# Altium integrated library Hoovic_Library.IntLib: 194 symbols
Pins are listed as number, name and electrical type; pins without a type are passive.

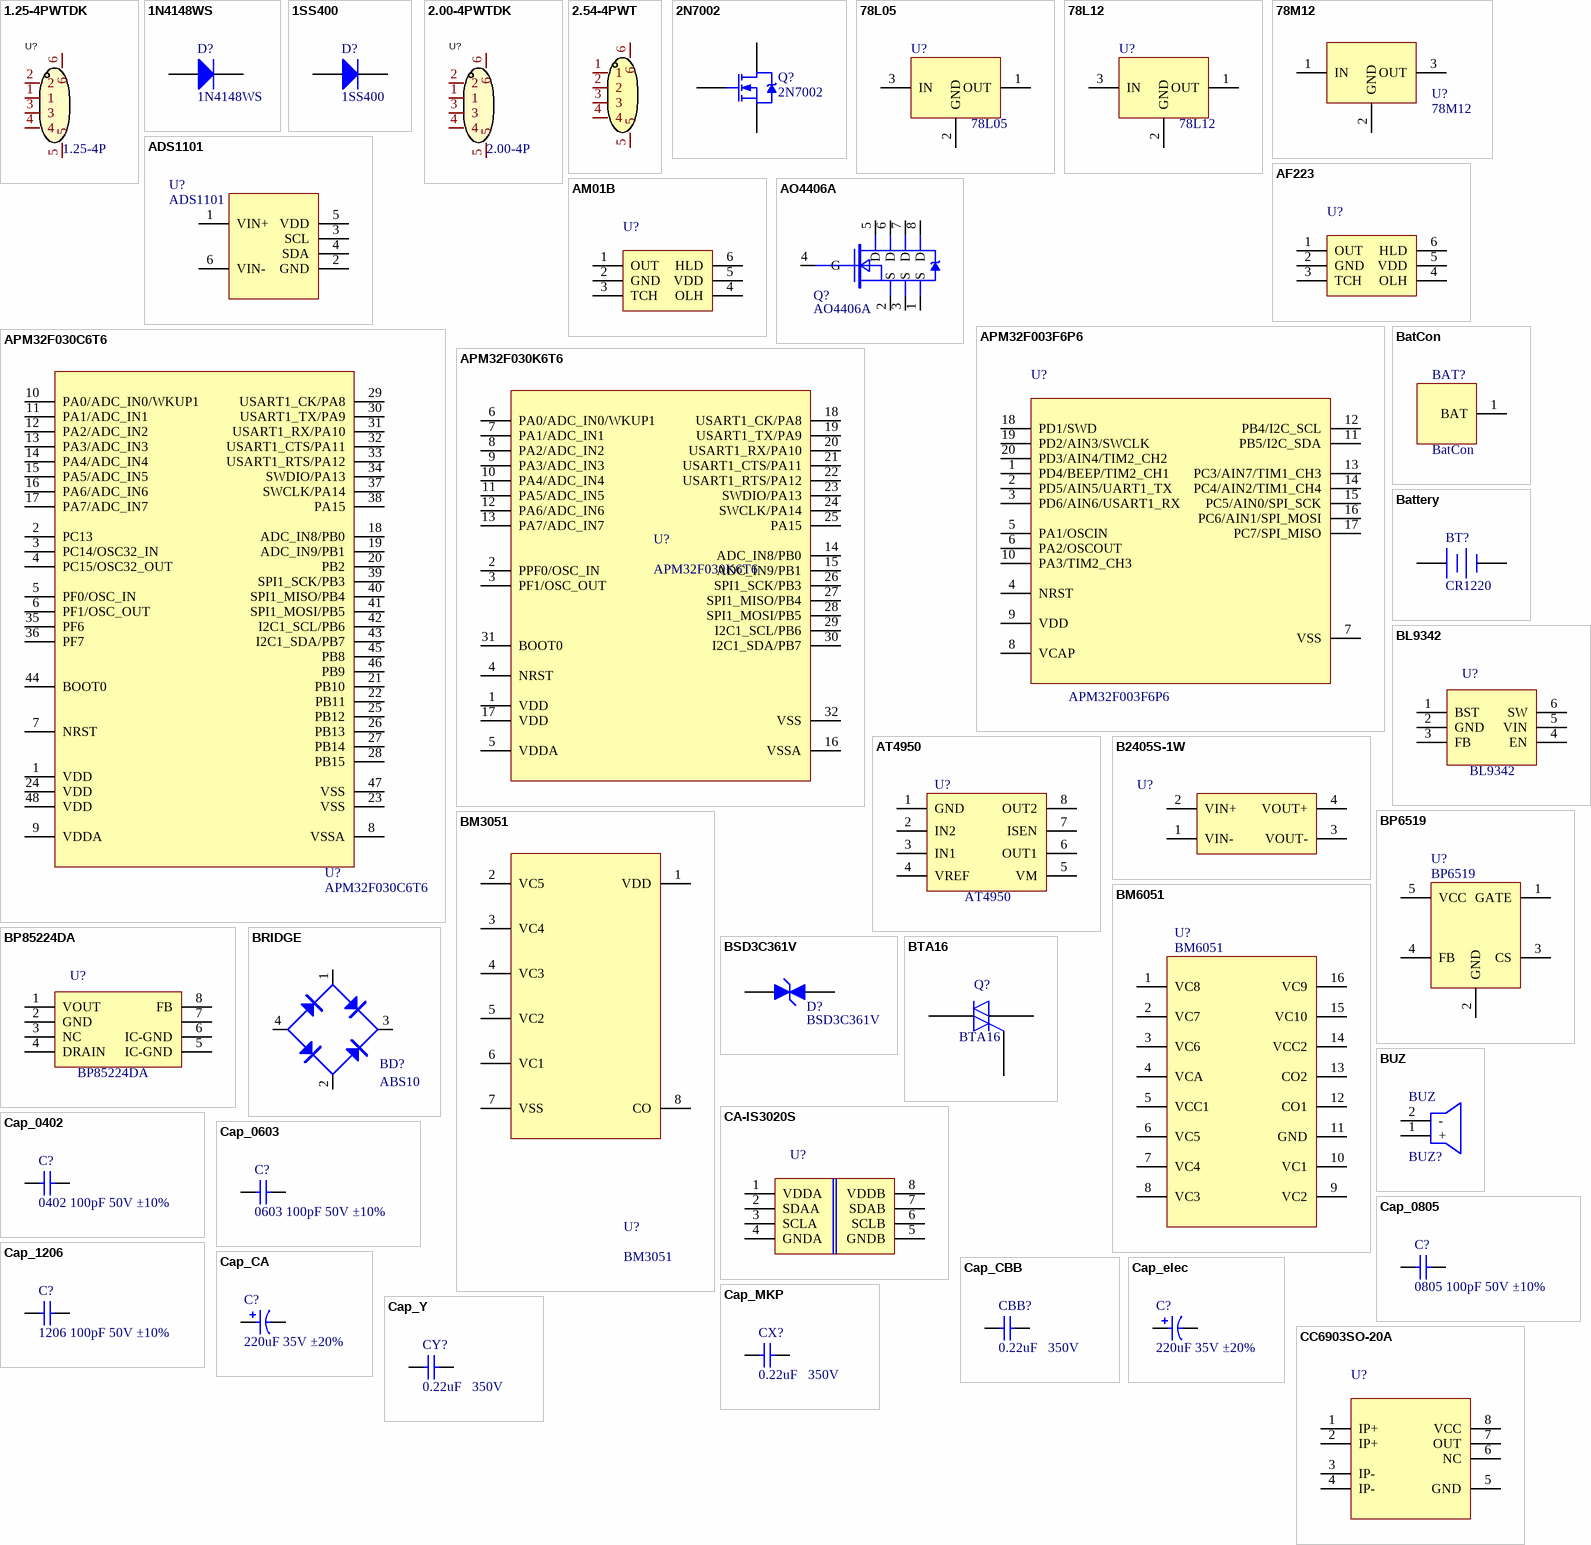
[diagram p0: symbols 1.25-4PWTDK to CC6903SO-20A]

## 1.25-4PWTDK
designator U?, comment 1.25-4P
连接器4pin，1.25间距; Manufacturer: SHOU HAN(首韩); Name: 1.25-4PWTDK; Add into BOM: yes; Pitch: 1.25mm; Pins Structure: 1x4P; Number of PINs Per Row: 4; Gender: 公型插针; Current Rating (Max): 1A; Symbol: 1.25-4PWTDK; Device: 1.25-4PWTDK; LCSC Part Name: 1.25间距 4P卧贴 带扣; Supplier Part: C3008554; Manufacturer Part: 1.25-4PWTDK; Supplier Footprint: SMD,P=1.25mm; JLCPCB Part Class: Extended Part; Datasheet: https://atta.szlcsc.com/upload/public/pdf/source/20220427/006CB3E3578F619E540A50F8B0C3F638.pdf; Supplier: LCSC; Convert to PCB: yes; Number of Rows: 1; Mounting Style: 卧贴; Operating Temperature Range: -25℃~+85℃
footprint CONN-SMD_4P-P1.25_GH-4AWB
3D model CONN-SMD_4P-P1.25_GH-4AWB
pins: 1, 2, 3, 4, 5, 6

## 1N4148WS
designator D?
贴片普通二极管 Vr=100V Io=150mA Vf=1.25V
footprint SOD-323F_L2.0-W1.6-LS2.5-RD
pins: 1 K, 2 A

## 1SS400
designator D?
贴片普通二极管 Vr=80V Io=100mA Vf=1.2V
footprint SOD-523
pins: 1 K, 2 A

## 2.00-4PWTDK
designator U?, comment 2.00-4P
连接器4pin，2.00间距; Manufacturer: SHOU HAN(首韩); Name: 1.25-4PWTDK; Add into BOM: yes; Pitch: 1.25mm; Pins Structure: 1x4P; Number of PINs Per Row: 4; Gender: 公型插针; Current Rating (Max): 1A; Symbol: 1.25-4PWTDK; Device: 1.25-4PWTDK; LCSC Part Name: 1.25间距 4P卧贴 带扣; Supplier Part: C3008554; Manufacturer Part: 1.25-4PWTDK; Supplier Footprint: SMD,P=1.25mm; JLCPCB Part Class: Extended Part; Datasheet: https://atta.szlcsc.com/upload/public/pdf/source/20220427/006CB3E3578F619E540A50F8B0C3F638.pdf; Supplier: LCSC; Convert to PCB: yes; Number of Rows: 1; Mounting Style: 卧贴; Operating Temperature Range: -25℃~+85℃
footprint CONN-SMD_4P-P2.00
3D model CONN-SMD_4P-P1.25_GH-4AWB
pins: 1, 2, 3, 4, 5, 6

## 2.54-4PWT
designator U?  (value not drawn)
连接器4pin，2.54间距; Manufacturer: SHOU HAN(首韩); Add into BOM: yes; Pitch: 2.5mm; Pins Structure: 1x4P; Number of PINs Per Row: 4; Gender: 公型插针; Current Rating (Max): 3A; Name: 2.54-4PWT; Symbol: 2.54-4PWT; Device: 2.54-4PWT; LCSC Part Name: 2.5mm 1x4P 卧贴 2.54间距 4P卧贴; Supplier Part: C3008582; Manufacturer Part: 2.54-4PWT; Supplier Footprint: SMD,P=2.5mm; JLCPCB Part Class: Extended Part; Datasheet: https://atta.szlcsc.com/upload/public/pdf/source/20220427/2E7F20871E2A02EADA0277D3DA8C9F6A.pdf; Supplier: LCSC; Convert to PCB: yes; Number of Rows: 1; Mounting Style: 卧贴; Operating Temperature Range: -25℃~+85℃
footprint COMM-SMD_4P-P2.50_SHOUHAN_2.54-4PWT
pins: 1, 2, 3, 4, 5, 6

## 2N7002
designator Q?
N-MOSFET with 3 Pin Vdss=60V  Id=115mA Vgs(th)=2.5V
footprint SOT-23-3-MOSFET
pins: 1 G, 2 D, 3 S

## 78L05
designator U?
电源芯片 Vin=30V Vout=5V 100mA 49dB@(120Hz)
footprint SOT-89
pins: 1 OUT, 2 GND, 3 IN

## 78L12
designator U?
电源芯片 Vin=27V Vout=12V 100mA 42dB@(120Hz)
footprint SOT-89
pins: 1 OUT, 2 GND, 3 IN

## 78M12
designator U?
电源芯片 Vin=35V Vout=12V 500mA 71dB@(120Hz)
footprint TO-252-2
pins: 1 IN, 2 GND, 3 OUT

## ADS1101
designator U?
转换芯片  带自校准功能的16it ADC 适用于2.7V~5.5V
footprint SOT-23-6
pins: 1 VIN+, 2 GND, 3 SCL, 4 SDA, 5 VDD, 6 VIN-

## AF223
designator U?  (value not drawn)
芯网单通道自校正触摸感应芯片
footprint SOT-23-6
pins: 1 OUT, 2 GND, 3 TCH, 4 OLH, 5 VDD, 6 HLD

## AM01B
designator U?  (value not drawn)
芯网单通道自校正触摸感应芯片
footprint SOT-23-6
pins: 1 OUT, 2 GND, 3 TCH, 4 OLH, 5 VDD, 6 HLD

## AO4406A
designator Q?
N-MOSFET with 8 Pin Vdss=30V Id=13A Vgs(th)=1.4V
footprint SOP-8_150mil
pins: 1 S, 2 S, 3 S, 4 G, 5 D, 6 D, 7 D, 8 D

## APM32F003F6P6
designator U?
极海APM32F003芯片TSSOP20封装
footprint TSSOP-20
footprint SOP-20_300mil
pins: 1 PD4/BEEP/TIM2_CH1, 2 PD5/AIN5/UART1_TX, 3 PD6/AIN6/USART1_RX, 4 NRST, 5 PA1/OSCIN, 6 PA2/OSCOUT, 7 VSS, 8 VCAP, 9 VDD, 10 PA3/TIM2_CH3, 11 PB5/I2C_SDA, 12 PB4/I2C_SCL, 13 PC3/AIN7/TIM1_CH3, 14 PC4/AIN2/TIM1_CH4, 15 PC5/AIN0/SPI_SCK, 16 PC6/AIN1/SPI_MOSI, 17 PC7/SPI_MISO, 18 PD1/SWD, 19 PD2/AIN3/SWCLK, 20 PD3/AIN4/TIM2_CH2

## APM32F030C6T6
designator U?
极海APM32F030芯片LQFP48封装
footprint LQFP-48
pins: 1 VDD, 2 PC13, 3 PC14/OSC32_IN, 4 PC15/OSC32_OUT, 5 PF0/OSC_IN, 6 PF1/OSC_OUT, 7 NRST, 8 VSSA, 9 VDDA, 10 PA0/ADC_IN0/WKUP1, 11 PA1/ADC_IN1, 12 PA2/ADC_IN2, 13 PA3/ADC_IN3, 14 PA4/ADC_IN4, 15 PA5/ADC_IN5, 16 PA6/ADC_IN6, 17 PA7/ADC_IN7, 18 ADC_IN8/PB0, 19 ADC_IN9/PB1, 20 PB2, 21 PB10, 22 PB11, 23 VSS, 24 VDD, 25 PB12, 26 PB13, 27 PB14, 28 PB15, 29 USART1_CK/PA8, 30 USART1_TX/PA9, 31 USART1_RX/PA10, 32 USART1_CTS/PA11, 33 USART1_RTS/PA12, 34 SWDIO/PA13, 35 PF6, 36 PF7, 37 SWCLK/PA14, 38 PA15, 39 SPI1_SCK/PB3, 40 SPI1_MISO/PB4, 41 SPI1_MOSI/PB5, 42 I2C1_SCL/PB6, 43 I2C1_SDA/PB7, 44 BOOT0, 45 PB8, 46 PB9, 47 VSS, 48 VDD

## APM32F030K6T6
designator U?
极海APM32F030芯片LQFP32封装
footprint LQFP-32
pins: 1 VDD, 2 PPF0/OSC_IN, 3 PF1/OSC_OUT, 4 NRST, 5 VDDA, 6 PA0/ADC_IN0/WKUP1, 7 PA1/ADC_IN1, 8 PA2/ADC_IN2, 9 PA3/ADC_IN3, 10 PA4/ADC_IN4, 11 PA5/ADC_IN5, 12 PA6/ADC_IN6, 13 PA7/ADC_IN7, 14 ADC_IN8/PB0, 15 ADC_IN9/PB1, 16 VSSA, 17 VDD, 18 USART1_CK/PA8, 19 USART1_TX/PA9, 20 USART1_RX/PA10, 21 USART1_CTS/PA11, 22 USART1_RTS/PA12, 23 SWDIO/PA13, 24 SWCLK/PA14, 25 PA15, 26 SPI1_SCK/PB3, 27 SPI1_MISO/PB4, 28 SPI1_MOSI/PB5, 29 I2C1_SCL/PB6, 30 I2C1_SDA/PB7, 31 BOOT0, 32 VSS

## AT4950
designator U?
单通道刷式直流电机驱动芯片
footprint SOP-8_150mil
pins: 1 GND, 2 IN2, 3 IN1, 4 VREF, 5 VM, 6 OUT1, 7 ISEN, 8 OUT2

## B2405S-1W
designator U?, comment BXXXS-1W  (value not drawn)
隔离型DCDC
footprint B2405S-1W
pins: 1 VIN-, 2 VIN+, 3 VOUT-, 4 VOUT+

## BatCon
designator BAT?
镍片 BMS产品电池连接端口
footprint BatCon_End_8mm
footprint BatCon_Mid_5mm
footprint BatCon_3936_5MM
footprint BatCon_3936_6.5MM
footprint BatCon_K55 (Battery connect pad for Kanaijia designed K55 BLDC)
footprint UVWPORT_C55
footprint UVWPORT_K55 (For connection of Kanaijia designed K55 BLDC)
footprint BATCON_M211
footprint BatCon_187W
footprint BatCon_L6.3-P5.0MM
footprint BatCon_4.8mm
pins: 1 BAT

## Battery
designator BT?, comment CR1220
电池/电池组
footprint BAT-SMD_CR1220-2ZX
pins: 1 +, 2 -

## BL9342
designator U?
DC-DC降压型
footprint SOT-23-6
pins: 1 BST, 2 GND, 3 FB, 4 EN, 5 VIN, 6 SW

## BM3051
designator U?
二次保护芯片 2~5 Cells Secondary Protection IC
footprint MSOP-8
footprint DFN-8_L2.5-W2.0-P0.50
pins: 1 VDD, 2 VC5, 3 VC4, 4 VC3, 5 VC2, 6 VC1, 7 VSS, 8 CO

## BM6051
designator U?
二次保护芯片 6~10 Cells Secondary Protection IC
footprint SOP-16_150mil
pins: 1 VC8, 2 VC7, 3 VC6, 4 VCA, 5 VCC1, 6 VC5, 7 VC4, 8 VC3, 9 VC2, 10 VC1, 11 GND, 12 CO1, 13 CO2, 14 VCC2, 15 VC10, 16 VC9

## BP6519
designator U?
非隔离恒压恒流控制芯片
footprint SOT-23-5
pins: 1 GATE, 2 GND, 3 CS, 4 FB, 5 VCC

## BP85224DA
designator U?
AC-DC降压型
footprint SOP-8_150mil
pins: 1 VOUT, 2 GND, 3 NC, 4 DRAIN, 5 IC-GND, 6 IC-GND, 7, 8 FB

## BRIDGE
designator BD?, comment ABS10
整流桥
footprint ABS10
footprint GBJ3510
footprint GBP_4P-L14.5-W3.5-P3.80-L
pins: 1 AC, 2 AC, 3 V+, 4 V-

## BSD3C361V
designator D?
静电放电(ESD)保护器件
footprint SOD-323_L1.8-W1.3-LS2.5-BI
pins: 1 C, 2 A

## BTA16
designator Q?
可控硅
footprint TO-220A
pins: 1, 2, 3

## BUZ
designator BUZ?
蜂鸣器
footprint BUZ-TH-D14-P7.5
pins: 1 +, 2 -

## CA-IS3020S
designator U?  (value not drawn)
低功耗双向通讯I2C总线隔离器
footprint SOP-8_150mil
pins: 1 VDDA, 2 SDAA, 3 SCLA, 4 GNDA, 5 GNDB, 6 SCLB, 7 SDAB, 8 VDDB

## Cap_0402
designator C?, comment 0402 100pF 50V ±10%
贴片电容
footprint C0402
pins: 1, 2

## Cap_0603
designator C?, comment 0603 100pF 50V ±10%
贴片电容
footprint C0603
pins: 1, 2

## Cap_0805
designator C?, comment 0805 100pF 50V ±10%
贴片电容
footprint C0805
footprint C0805 - PADS
pins: 1, 2

## Cap_1206
designator C?, comment 1206 100pF 50V ±10%
贴片电容
footprint C1206
footprint C1206 - PADS
pins: 1, 2

## Cap_CA
designator C?, comment 220uF 35V ±20%
钽电容
footprint CASE-A_3216
pins: 1, 2
1 alternate drawing of the same symbol

## Cap_CBB
designator CBB?, comment 0.22uF   350V
CBB电容
footprint CAP-TH-CBB_L16.5-W10-H14.5-P15MM
pins: 1, 2

## Cap_elec
designator C?, comment 220uF 35V ±20%
电解电容
footprint CAP-TH_BD6.3-P2.50-D1.0-FD
footprint CAP-TH_BD8-P3.50-D1.0-FD
footprint CAP-TH_BD10-P5.0-D1.0-FD
footprint CAP-TH_BD18-P7.5-D1.1
footprint CAP-TH_BD5.0-P2.00-D0.6-FD
footprint CAP-SMD_D6.3-L7.7
footprint CAP_TH-BD50-D35-P10.5MM
footprint CAP-TH_BD12.5-D6.5-P2.5MM
footprint CAP-TH_BD16.5-D8.0-P2.5MM
footprint CAP-TH_BD12.5-P5.00-D0.6-FD
footprint CAP-SMD_BD8.0-L8.3-W8.3-FD
footprint CAP-SMD_BD6.3-L6.6-W6.6-LS7.4-FD
footprint CAP-TH_BD8-P3.50-D1.0-WD
footprint CAP-TH_BD6.3-P2.50-D1.0-WD
pins: 1, 2
1 alternate drawing of the same symbol

## Cap_MKP
designator CX?, comment 0.22uF   350V
安规电容
footprint CAP-TH-MKP_L12.5-W6.0-H12-P10MM
footprint CAP-TH-MKP_L13-W6-P10
footprint CAP-TH-MKP_L17-W10-H16-P15MM
footprint CAP-TH-MKP_L18-W10-H18-P15
pins: 1, 2

## Cap_Y
designator CY?, comment 0.22uF   350V
Y电容
footprint CAP-TH-Y_L10-W4-P10MM
pins: 1, 2

## CC6903SO-20A
designator U?  (value not drawn)
单芯片霍尔效应电流传感器 20A
footprint SOP-8_150mil
pins: 1 IP+, 2 IP+, 3 IP-, 4 IP-, 5 GND, 6 NC, 7 OUT, 8 VCC

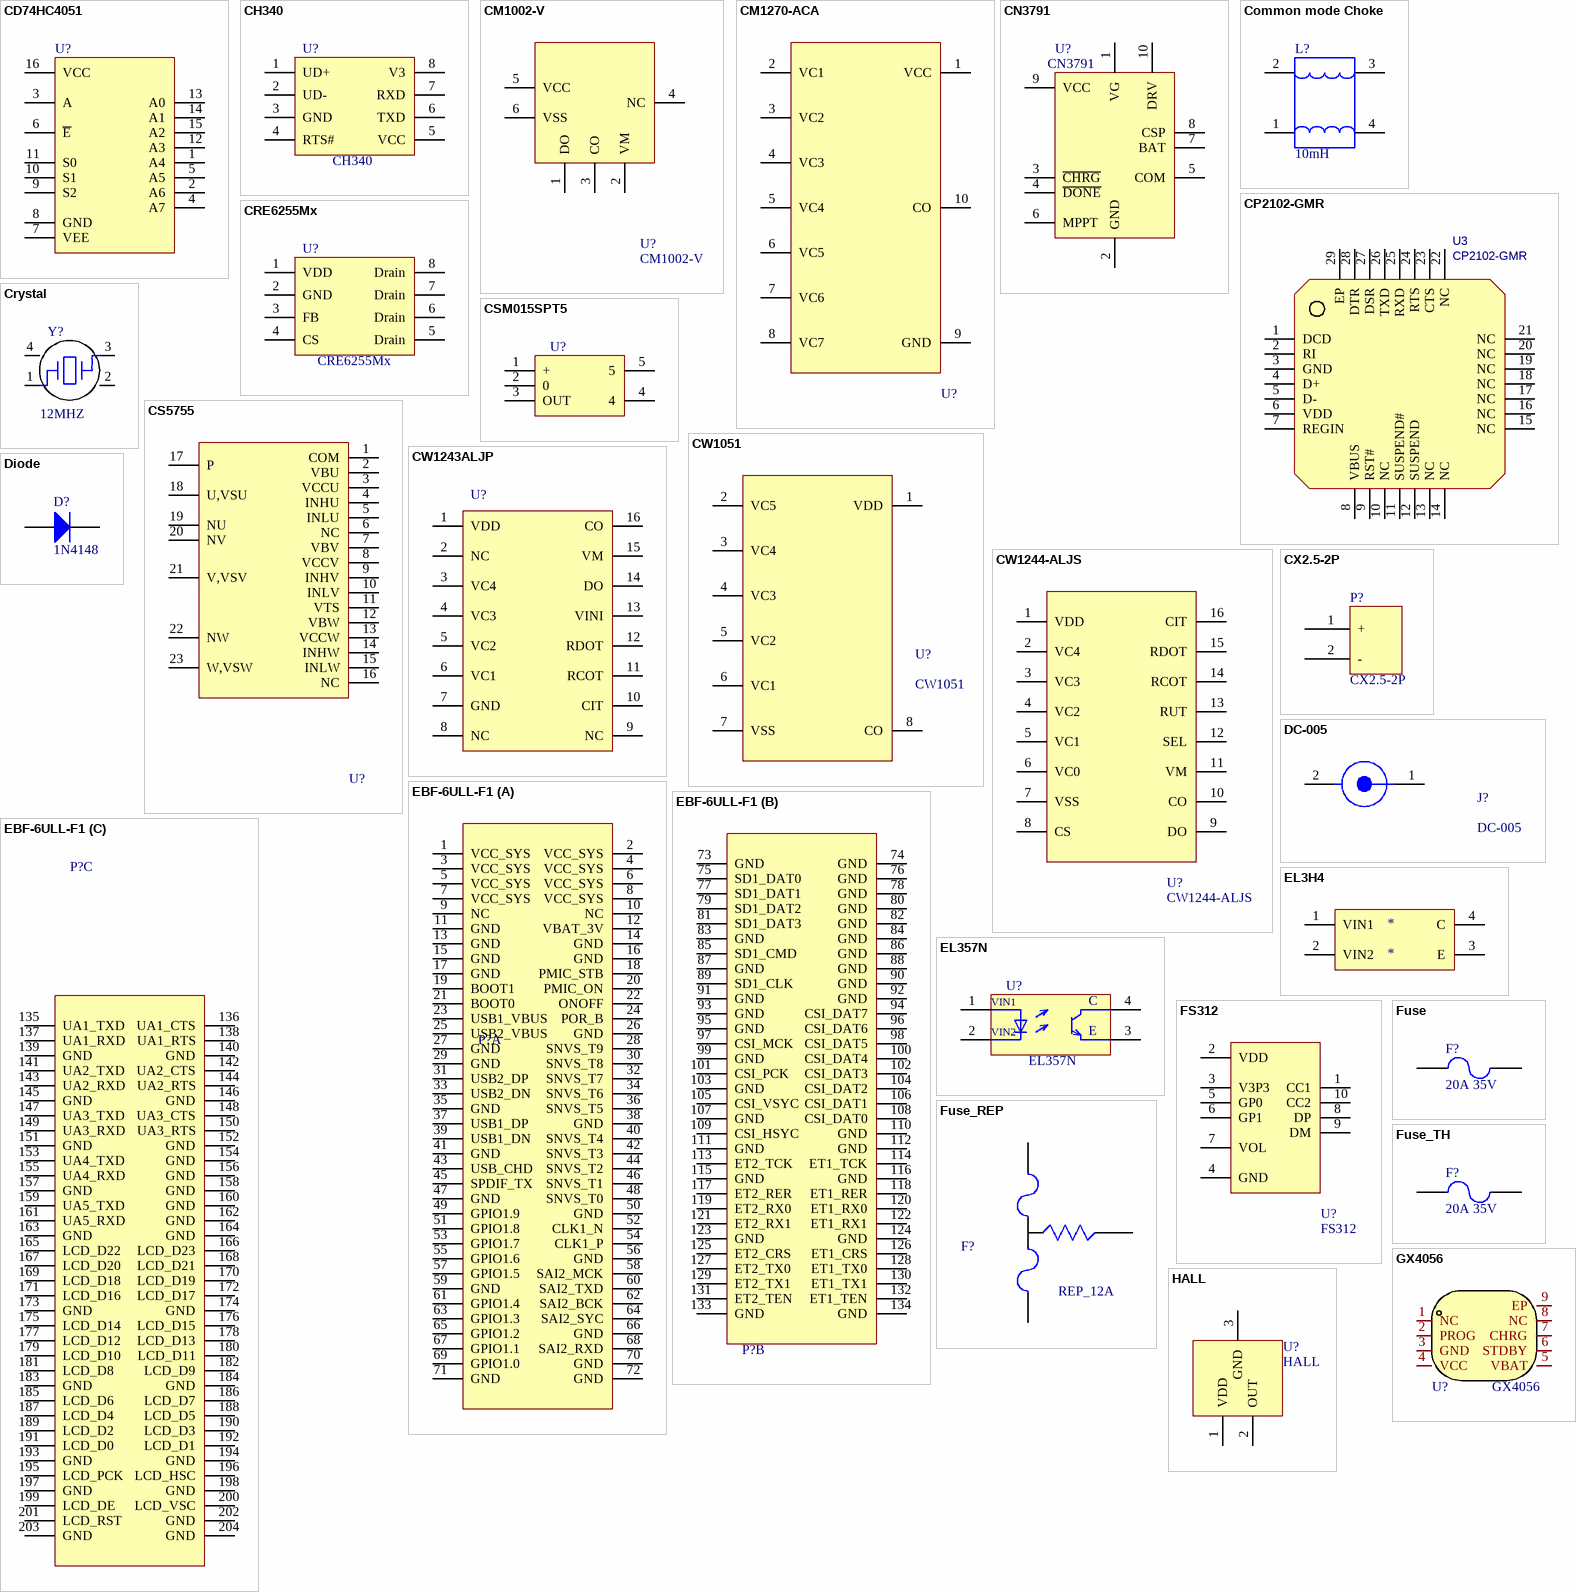
[diagram p1: symbols CD74HC4051 to HALL]

## CD74HC4051
designator U?  (value not drawn)
高速CMOS逻辑模拟多路复用器和多路信号分离器
footprint SOP-16_150mil
pins: 1 A4, 2 A6, 3 A, 4 A7, 5 A5, 6 ~{E}, 7 VEE, 8 GND, 9 S2, 10 S1, 11 S0, 12 A3, 13 A0, 14 A1, 15 A2, 16 VCC

## CH340
designator U?
USB转串口芯片
footprint SOP-8_150mil
pins: 1 UD+, 2 UD-, 3 GND, 4 RTS#, 5 VCC, 6 TXD, 7 RXD, 8 V3

## CM1002-V
designator U?
单节电池保护IC
footprint SOT-23-6
pins: 1 DO, 2 VM, 3 CO, 4 NC, 5 VCC, 6 VSS

## CM1270-ACA
designator U?  (value not drawn)
6~7 串可充电锂电池保护 IC（2 级保护用）
footprint MSOP-10
pins: 1 VCC, 2 VC1, 3 VC2, 4 VC3, 5 VC4, 6 VC5, 7 VC6, 8 VC7, 9 GND, 10 CO

## CN3791
designator U?
具有太阳能电池最大功率点跟踪功能的4A单节锂电池充电管理集成电路
footprint SSOP-10
pins: 1 VG, 2 GND, 3 ~{CHRG}, 4 ~{DONE}, 5 COM, 6 MPPT, 7 BAT, 8 CSP, 9 VCC, 10 DRV

## Common mode Choke
designator L?, comment 10mH
共模电感
footprint IND_L14-W6.5-H13
footprint PDMCAT1386
footprint IND_L36-W18-H32-5MM
footprint IND_L20-W9-H20
pins: 1, 2, 3, 4

## CP2102-GMR
designator U3
USB 驱动器/接收器; BOM_Manufacturer: SILICON LABS; BOM_Supplier: LCSC; BOM_Manufacturer Part: CP2102-GMR; BOM_Supplier Part: C6568; BOM_JLCPCB Part Class: Basic Part; spicePre: U; spiceSymbolName: CP2102-GMR
footprint QFN28-0.5-5X5MM
pins: 1 DCD, 2 RI, 3 GND, 4 D+, 5 D-, 6 VDD, 7 REGIN, 8 VBUS, 9 RST#, 10 NC, 11 SUSPEND#, 12 SUSPEND, 13 NC, 14 NC, 15 NC, 16 NC, 17 NC, 18 NC, 19 NC, 20 NC, 21 NC, 22 NC, 23 CTS, 24 RTS, 25 RXD, 26 TXD, 27 DSR, 28 DTR, 29 EP

## CRE6255Mx
designator U?
单通道刷式直流电机驱动芯片
footprint SOP-8_150mil
pins: 1 VDD, 2 GND, 3 FB, 4 CS, 5 Drain, 6 Drain, 7 Drain, 8 Drain

## Crystal
designator Y?, comment 12MHZ
晶振
footprint XO_3225
pins: 1, 2, 3, 4

## CS5755
designator U?, comment CM1270-ACA  (value not drawn)
MOS电路模块
footprint SOP23-H
pins: 1 COM, 2 VBU, 3 VCCU, 4 INHU, 5 INLU, 6 NC, 7 VBV, 8 VCCV, 9 INHV, 10 INLV, 11 VTS, 12 VBW, 13 VCCW, 14 INHW, 15 INLW, 16 NC, 17 P, 18 U,VSU, 19 NU, 20 NV, 21 V,VSV, 22 NW, 23 W,VSW

## CSM015SPT5
designator U?  (value not drawn)
霍尔电流传感器
footprint SENSOR-TH_CSM015SPT5
pins: 1 +, 2 0, 3 OUT, 4, 5

## CW1051
designator U?
3~5 Channel Secondary Protection IC
footprint MSOP-8
footprint DFN3X4-8L
pins: 1 VDD, 2 VC5, 3 VC4, 4 VC3, 5 VC2, 6 VC1, 7 VSS, 8 CO

## CW1243ALJP
designator U?  (value not drawn)
二次保护芯片，4串保护IC
footprint SOP-16_150mil
pins: 1 VDD, 2 NC, 3 VC4, 4 VC3, 5 VC2, 6 VC1, 7 GND, 8 NC, 9 NC, 10 CIT, 11 RCOT, 12 RDOT, 13 VINI, 14 DO, 15 VM, 16 CO

## CW1244-ALJS
designator U?
3~4 节电池保护IC
footprint TSSOP-16
footprint SOP-16_150mil - PADS
pins: 1 VDD, 2 VC4, 3 VC3, 4 VC2, 5 VC1, 6 VC0, 7 VSS, 8 CS, 9 DO, 10 CO, 11 VM, 12 SEL, 13 RUT, 14 RCOT, 15 RDOT, 16 CIT

## CX2.5-2P
designator P?
磁吸端子 弯插 2pin 2.5针距
footprint CX2.5-2P
pins: 1 +, 2 -

## DC-005
designator J?
DC-JACK圆头电源连接器
footprint DC-005
footprint DC-015-L
footprint DC-037
pins: 1 VIN, 2 GND

## Diode
designator D?, comment 1N4148
Default Diode
footprint SOD-323F_L2.0-W1.6-LS2.5-RD
footprint SMA
footprint SOD-123
footprint SOD-523
footprint SMB
footprint SMC
pins: 1 K, 2 A

## EBF-6ULL-F1
designator P?  (value not drawn)
野火NXP i.MX6ULL金手指核心板
footprint CONN-SMD_204P-P0.60_AS0A621-H2S6-7H
part A pins: 1 VCC_SYS, 2 VCC_SYS, 3 VCC_SYS, 4 VCC_SYS, 5 VCC_SYS, 6 VCC_SYS, 7 VCC_SYS, 8 VCC_SYS, 9 NC, 10 NC, 11 GND, 12 VBAT_3V, 13 GND, 14 GND, 15 GND, 16 GND, 17 GND, 18 PMIC_STB, 19 BOOT1, 20 PMIC_ON, 21 BOOT0, 22 ONOFF, 23 USB1_VBUS, 24 POR_B, 25 USB2_VBUS, 26 GND, 27 GND, 28 SNVS_T9, 29 GND, 30 SNVS_T8, 31 USB2_DP, 32 SNVS_T7, 33 USB2_DN, 34 SNVS_T6, 35 GND, 36 SNVS_T5, 37 USB1_DP, 38 GND, 39 USB1_DN, 40 SNVS_T4, 41 GND, 42 SNVS_T3, 43 USB_CHD, 44 SNVS_T2, 45 SPDIF_TX, 46 SNVS_T1, 47 GND, 48 SNVS_T0, 49 GPIO1.9, 50 GND, 51 GPIO1.8, 52 CLK1_N, 53 GPIO1.7, 54 CLK1_P, 55 GPIO1.6, 56 GND, 57 GPIO1.5, 58 SAI2_MCK, 59 GND, 60 SAI2_TXD, 61 GPIO1.4, 62 SAI2_BCK, 63 GPIO1.3, 64 SAI2_SYC, 65 GPIO1.2, 66 GND, 67 GPIO1.1, 68 SAI2_RXD, 69 GPIO1.0, 70 GND, 71 GND, 72 GND
part B pins: 73 GND, 74 GND, 75 SD1_DAT0, 76 GND, 77 SD1_DAT1, 78 GND, 79 SD1_DAT2, 80 GND, 81 SD1_DAT3, 82 GND, 83 GND, 84 GND, 85 SD1_CMD, 86 GND, 87 GND, 88 GND, 89 SD1_CLK, 90 GND, 91 GND, 92 GND, 93 GND, 94 CSI_DAT7, 95 GND, 96 CSI_DAT6, 97 CSI_MCK, 98 CSI_DAT5, 99 GND, 100 CSI_DAT4, 101 CSI_PCK, 102 CSI_DAT3, 103 GND, 104 CSI_DAT2, 105 CSI_VSYC, 106 CSI_DAT1, 107 GND, 108 CSI_DAT0, 109 CSI_HSYC, 110 GND, 111 GND, 112 GND, 113 ET2_TCK, 114 ET1_TCK, 115 GND, 116 GND, 117 ET2_RER, 118 ET1_RER, 119 ET2_RX0, 120 ET1_RX0, 121 ET2_RX1, 122 ET1_RX1, 123 GND, 124 GND, 125 ET2_CRS, 126 ET1_CRS, 127 ET2_TX0, 128 ET1_TX0, 129 ET2_TX1, 130 ET1_TX1, 131 ET2_TEN, 132 ET1_TEN, 133 GND, 134 GND
part C pins: 135 UA1_TXD, 136 UA1_CTS, 137 UA1_RXD, 138 UA1_RTS, 139 GND, 140 GND, 141 UA2_TXD, 142 UA2_CTS, 143 UA2_RXD, 144 UA2_RTS, 145 GND, 146 GND, 147 UA3_TXD, 148 UA3_CTS, 149 UA3_RXD, 150 UA3_RTS, 151 GND, 152 GND, 153 UA4_TXD, 154 GND, 155 UA4_RXD, 156 GND, 157 GND, 158 GND, 159 UA5_TXD, 160 GND, 161 UA5_RXD, 162 GND, 163 GND, 164 GND, 165 LCD_D22, 166 LCD_D23, 167 LCD_D20, 168 LCD_D21, 169 LCD_D18, 170 LCD_D19, 171 LCD_D16, 172 LCD_D17, 173 GND, 174 GND, 175 LCD_D14, 176 LCD_D15, 177 LCD_D12, 178 LCD_D13, 179 LCD_D10, 180 LCD_D11, 181 LCD_D8, 182 LCD_D9, 183 GND, 184 GND, 185 LCD_D6, 186 LCD_D7, 187 LCD_D4, 188 LCD_D5, 189 LCD_D2, 190 LCD_D3, 191 LCD_D0, 192 LCD_D1, 193 GND, 194 GND, 195 LCD_PCK, 196 LCD_HSC, 197 GND, 198 GND, 199 LCD_DE, 200 LCD_VSC, 201 LCD_RST, 202 GND, 203 GND, 204 GND

## EL3H4
designator *
光耦-光电晶体管输出
footprint SSOP-4
pins: 1 VIN1, 2 VIN2, 3 E, 4 C

## EL357N
designator U?
光耦-光电晶体管输出
footprint SOP-4
footprint DIP-4
pins: 1 VIN1, 2 VIN2, 3 E, 4 C

## FS312
designator U?
USB Type-C PD快充协议智能触发诱骗芯片
footprint SSOP-10
pins: 1 CC1, 2 VDD, 3 V3P3, 4 GND, 5 GP0, 6 GP1, 7 VOL, 8 DP, 9 DM, 10 CC2

## Fuse
designator F?, comment 20A 35V
保险丝/熔断器
footprint F1206
footprint FUSE_L6.1_W2.5
footprint FUSE_L30-D6.0
footprint FUSE_TH-L8-W4-P5.08
pins: 1, 2

## Fuse_REP
designator F?, comment REP_12A
三端保险丝/熔断器
footprint FUSE_L4.0_W3.0
pins: 1, 2, 3

## Fuse_TH
designator F?, comment 20A 35V
直插式保险丝/熔断器
footprint FUSE-TH_BD5.5-L21.5-P25.50-D1.2
footprint FUSE_L30-D6.0
pins: 1, 2

## GX4056
designator U?
1000mA 锂电池充电器芯片; Manufacturer: 国芯佳品; Add into BOM: yes; Maximum Charge Current: 1A; Name: GX4056; Symbol: GX4056; Device: GX4056; LCSC Part Name: GX4056; Supplier Part: C5259236; Manufacturer Part: GX4056; Supplier Footprint: SOP-8-EP; JLCPCB Part Class: Extended Part; Datasheet: https://atta.szlcsc.com/upload/public/pdf/source/20221111/1186739FA5174D5673D9C2FF440403FD.pdf; Supplier: LCSC; Convert to PCB: yes
footprint SOP-8-EP
pins: 1 NC, 2 PROG, 3 GND, 4 VCC, 5 VBAT, 6 STDBY, 7 CHRG, 8 NC, 9 EP

## HALL
designator U?
霍尔传感器（请在COMMENT中填写型号）
footprint SOT-23-3
pins: 1 VDD, 2 OUT, 3 GND

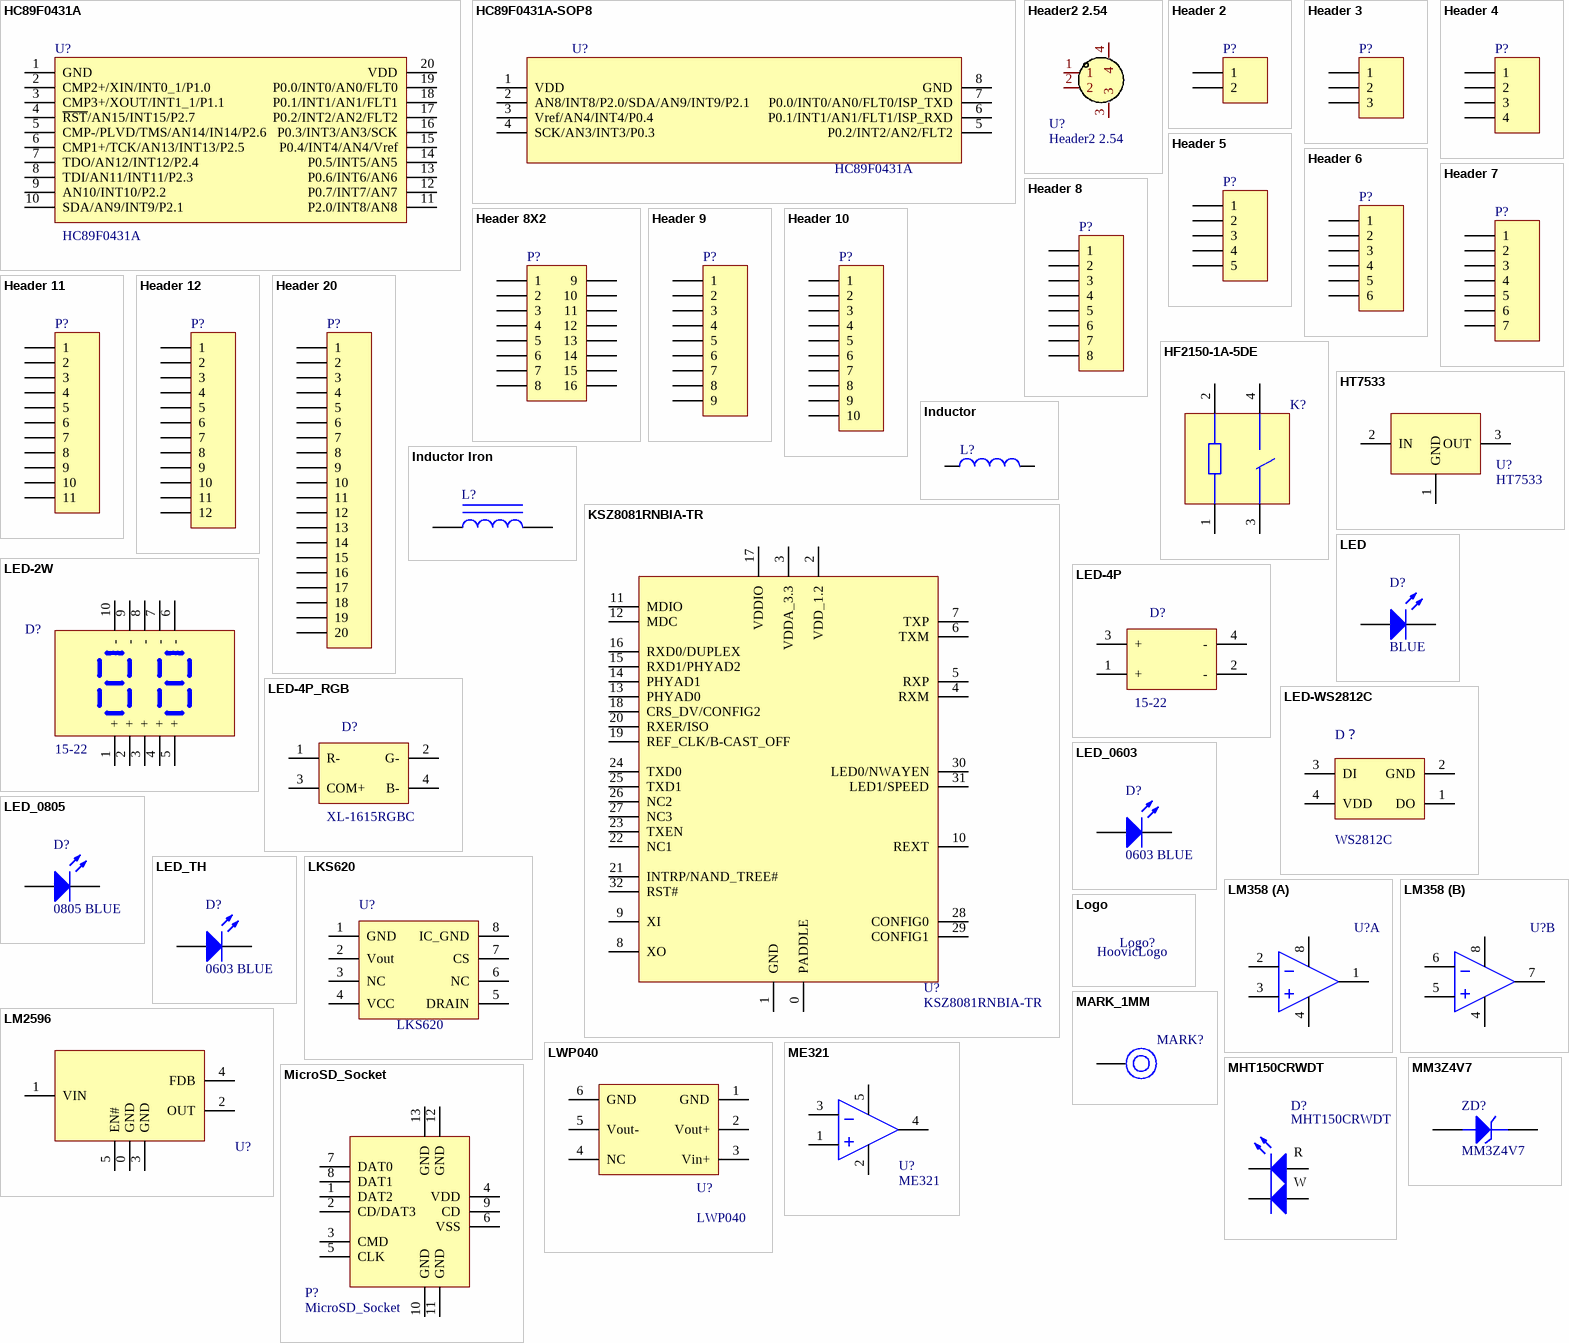
[diagram p2: symbols HC89F0431A to MM3Z4V7]

## HC89F0431A
designator U?
芯圣HC89F0431A
footprint SOP-20_400mil
pins: 1 GND, 2 CMP2+/XIN/INT0_1/P1.0, 3 CMP3+/XOUT/INT1_1/P1.1, 4 ~{RST}/AN15/INT15/P2.7, 5 CMP-/PLVD/TMS/AN14/IN14/P2.6, 6 CMP1+/TCK/AN13/INT13/P2.5, 7 TDO/AN12/INT12/P2.4, 8 TDI/AN11/INT11/P2.3, 9 AN10/INT10/P2.2, 10 SDA/AN9/INT9/P2.1, 11 P2.0/INT8/AN8, 12 P0.7/INT7/AN7, 13 P0.6/INT6/AN6, 14 P0.5/INT5/AN5, 15 P0.4/INT4/AN4/Vref, 16 P0.3/INT3/AN3/SCK, 17 P0.2/INT2/AN2/FLT2, 18 P0.1/INT1/AN1/FLT1, 19 P0.0/INT0/AN0/FLT0, 20 VDD

## HC89F0431A-SOP8
designator U?, comment HC89F0431A
芯圣HC89F0431A SOP-8封装
footprint SOP-8_150mil
pins: 1 VDD, 2 AN8/INT8/P2.0/SDA/AN9/INT9/P2.1, 3 Vref/AN4/INT4/P0.4, 4 SCK/AN3/INT3/P0.3, 5 P0.2/INT2/AN2/FLT2, 6 P0.1/INT1/AN1/FLT1/ISP_RXD, 7 P0.0/INT0/AN0/FLT0/ISP_TXD, 8 GND

## Header2 2.54
designator U?
Manufacturer: SHOU HAN(首韩); Name: 2.54-2PWTDK; Add into BOM: yes; Pitch: 2.5mm; Pins Structure: 1x2P; Number of PINs Per Row: 2; Gender: 公型插针; Current Rating (Max): 3A; Symbol: 2.54-2PWTDK; Device: 2.54-2PWTDK; LCSC Part Name: 2.5mm 1x2P 卧贴 2.54间距 2P卧贴 带扣; Supplier Part: C3008572; Manufacturer Part: 2.54-2PWTDK; Supplier Footprint: SMD,P=2.5mm; JLCPCB Part Class: Extended Part; Datasheet: https://atta.szlcsc.com/upload/public/pdf/source/20220427/7A9947C604ED9079A5B03A0847CCE1E0.pdf; Supplier: LCSC; Convert to PCB: yes; Number of Rows: 1; Mounting Style: 卧贴; Operating Temperature Range: -25℃~+85℃
footprint CONN-SMD_2P-P2.50_SHOU_2.54-2PWTDK
pins: 1, 2, 3, 4

## Header 2
designator P?  (value not drawn)
连接器, 2-Pin
footprint CONN-TH_2P-P2.00_PH-2AW
footprint CONN-TH_VH3.96-2A-DIR
footprint CONN-TH_VH3.96-2A-SID
footprint CONN-TH_2P-2.54-DIR
footprint CONN-TH_2P-P2.00_A2001WV-XP
footprint CONN-TH_2P-2.0-NTC
footprint CONN-SMD_HY2.0-2P
footprint CONN-TH_2P-P2.50_HX25003-2A
footprint CONN-JC20_2P-P2.00
footprint CONN-JC25_2P-P2.50
footprint CONN-TH_2P-P2.54_XH-2AW
footprint CONN-TH_VH3.96-2A-MIDNONE
pins: 1, 2

## Header 3
designator P?  (value not drawn)
连接器, 3-Pin
footprint CONN-TH_3P-P1.25_L3.2-W5.5
footprint CONN-TH_3P-P2.00_PH--3AW
footprint CONN-TH_3P-2.54-DIR
footprint CONN-TH_3P-P2.00_A2001WV-XP
footprint CONN-TH_3P-P2.50_HX25003-3A
footprint CONN-TH_VH3.96-3A-DIR
footprint CONN-JC20_3P-P2.00
footprint BatCon_3PIN_2.5mm
footprint BatCon_3PIN_2.5mm_MAL
pins: 1, 2, 3

## Header 4
designator P?  (value not drawn)
连接器, 4-Pin
footprint CONN-TH_4P-P1.25_L3.2-W6.8
footprint TestSocket_4P_2.0mm
footprint CONN-TH_4P-P2.00_PH--4AW
footprint CONN-TH_4P-2.54-DIR
footprint CONN-TH_4P-P2.00_A2001WV-XP
footprint CONN-SMD_4P-P1.25_JS_GH125-S04CCA-00
footprint CONN-JC20_4P-P2.00
footprint BatCon_4PIN_2.5mm
footprint CONN-TH_4P-P2.50_HX25004-4A
footprint CONN-TH_4P-P2.50_HX25004-4AW
pins: 1, 2, 3, 4

## Header 5
designator P?  (value not drawn)
连接器, 5-Pin
footprint CONN-TH_5P-P1.25_L3.2-W8.0
footprint CONN-TH_5P-P2.00_PH--5AW
footprint CONN-TH_5P-2.54-DIR
footprint TestSocket_5P_2.0mm
footprint CONN-TH_5P-P2.00_A2001WV-XP
pins: 1, 2, 3, 4, 5

## Header 6
designator P?  (value not drawn)
连接器, 6-Pin
footprint CONN-TH_6P-2.54-DIR
footprint BatCon_6PIN_2.5mm
footprint HY2.0_SMD_6P
footprint CONN-TH_6P-2.54
pins: 1, 2, 3, 4, 5, 6

## Header 7
designator P?  (value not drawn)
连接器, 7-Pin
footprint CONN-TH_7P-2.54-DIR
footprint CONN-TH_7P-2.00-DIR
footprint CONN-TH_7P-P2.00_PH-7AW
footprint CONN-TH_7P-P2.54_XH-7A
pins: 1, 2, 3, 4, 5, 6, 7

## Header 8
designator P?  (value not drawn)
连接器, 8-Pin
footprint CONN-TH_8P-2.54-DIR
footprint BatCon_8PIN_2.5mm
footprint BatCon_8PIN_2.5mm_MAL
footprint CONN-TH_8P-P2.00_PH-8AW
footprint BatCon_8PIN_2.5mm - Fool
pins: 1, 2, 3, 4, 5, 6, 7, 8

## Header 8X2
designator P?
连接器, 8-Pin, Dual row
footprint CONN-TH_2*8P-1.27-DIR
pins: 1, 2, 3, 4, 5, 6, 7, 8, 9, 10, 11, 12, 13, 14, 15, 16
